# Altium footprint library SBCLib.PcbLib: 120 footprints (part 5 of 8)
Each footprint in its own frame and in the unit in brackets; x right, y up, seen from the top. Pads: shape width x height; smd on the part's side, far side on the other; paste and mask are expansions set on the pad; w line width, h text height; cw(c..) or ccw(c..) is an arc to the next point about the centre after c.
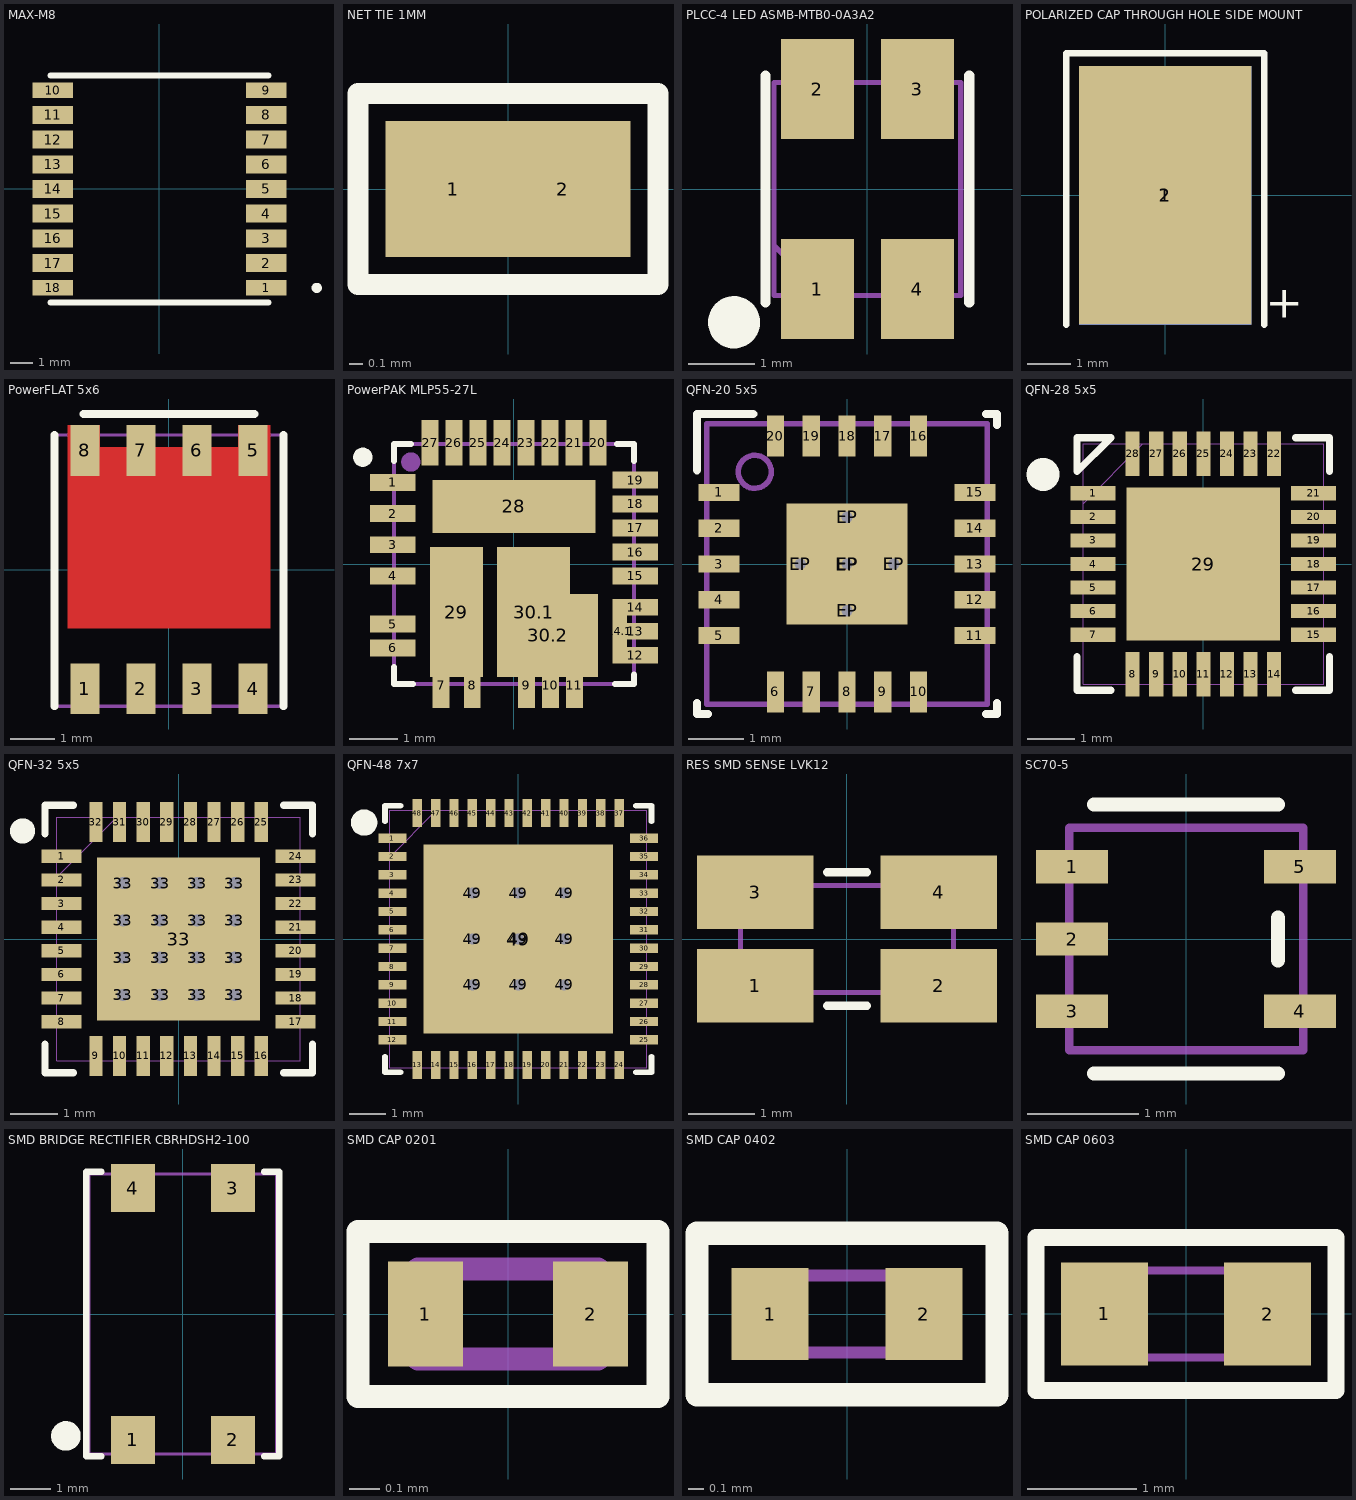
[diagram p4: the footprints below, top view; thin cyan lines are the x and y axes]

## MAX-M8 [mm] "u-blox M8 concurrent GNSS modules"
height 2.7
pads (18):
  rect 1.8x0.7 smd paste-10: 1(4.75,-4.4) 9(4.75,4.4) 10(-4.75,4.4) 18(-4.75,-4.4)
  rect 1.8x0.8 smd paste-10: 2(4.75,-3.3) 3(4.75,-2.2) 4(4.75,-1.1) 5(4.75,0) 6(4.75,1.1) 7(4.75,2.2) 8(4.75,3.3) 11(-4.75,3.3) 12(-4.75,2.2) 13(-4.75,1.1) 14(-4.75,0) 15(-4.75,-1.1) 16(-4.75,-2.2) 17(-4.75,-3.3)
Top Overlay:
  circle w0.254: c7,-4.4 r0.1
  lines w0.254: -4.85,-5.05 4.85,-5.05 ; -4.85,5.05 4.85,5.05
Top Paste:
  region: -6.25,4.75 -6.25,4.05 -4.85,4.05 -4.85,4.15 -3.95,4.15 -3.95,4.65 -4.85,4.65 -4.85,4.75
  region: 6.25,4.05 6.25,4.75 4.85,4.75 4.85,4.65 3.95,4.65 3.95,4.15 4.85,4.15 4.85,4.05
  region: 6.25,-4.75 6.25,-4.05 4.85,-4.05 4.85,-4.15 3.95,-4.15 3.95,-4.65 4.85,-4.65 4.85,-4.75
  region: -6.25,-4.05 -6.25,-4.75 -4.85,-4.75 -4.85,-4.65 -3.95,-4.65 -3.95,-4.15 -4.85,-4.15 -4.85,-4.05
  region: -6.25,3.7 -6.25,2.9 -4.85,2.9 -4.85,3 -3.95,3 -3.95,3.6 -4.85,3.6 -4.85,3.7
  region: -6.25,2.6 -6.25,1.8 -4.85,1.8 -4.85,1.9 -3.95,1.9 -3.95,2.5 -4.85,2.5 -4.85,2.6
  region: -6.25,1.5 -6.25,0.7 -4.85,0.7 -4.85,0.8 -3.95,0.8 -3.95,1.4 -4.85,1.4 -4.85,1.5
  region: -6.25,0.4 -6.25,-0.4 -4.85,-0.4 -4.85,-0.3 -3.95,-0.3 -3.95,0.3 -4.85,0.3 -4.85,0.4
  region: -6.25,-0.7 -6.25,-1.5 -4.85,-1.5 -4.85,-1.4 -3.95,-1.4 -3.95,-0.8 -4.85,-0.8 -4.85,-0.7
  region: -6.25,-1.8 -6.25,-2.6 -4.85,-2.6 -4.85,-2.5 -3.95,-2.5 -3.95,-1.9 -4.85,-1.9 -4.85,-1.8
  region: -6.25,-2.9 -6.25,-3.7 -4.85,-3.7 -4.85,-3.6 -3.95,-3.6 -3.95,-3 -4.85,-3 -4.85,-2.9
  region: 6.25,-3.7 6.25,-2.9 4.85,-2.9 4.85,-3 3.95,-3 3.95,-3.6 4.85,-3.6 4.85,-3.7
  region: 6.25,-2.6 6.25,-1.8 4.85,-1.8 4.85,-1.9 3.95,-1.9 3.95,-2.5 4.85,-2.5 4.85,-2.6
  region: 6.25,-1.5 6.25,-0.7 4.85,-0.7 4.85,-0.8 3.95,-0.8 3.95,-1.4 4.85,-1.4 4.85,-1.5
  region: 6.25,-0.4 6.25,0.4 4.85,0.4 4.85,0.3 3.95,0.3 3.95,-0.3 4.85,-0.3 4.85,-0.4
  region: 6.25,0.7 6.25,1.5 4.85,1.5 4.85,1.4 3.95,1.4 3.95,0.8 4.85,0.8 4.85,0.7
  region: 6.25,1.8 6.25,2.6 4.85,2.6 4.85,2.5 3.95,2.5 3.95,1.9 4.85,1.9 4.85,1.8
  region: 6.25,2.9 6.25,3.7 4.85,3.7 4.85,3.6 3.95,3.6 3.95,3 4.85,3 4.85,2.9
3D body "MAX (STEP-AP214).STEP": height 2.47, standoff 0, extent -4.698,-5.106 5.002,4.994

## NET TIE 1MM [mm]
pads (2):
  rect 1x1 smd paste-10 mask-2: 1(-0.4,0) 2(0.4,0)
Top Overlay:
  lines w0.152: -1.1,-0.7 -1.1,0.7 1.1,0.7 1.1,-0.7 -1.1,-0.7

## PLCC-4 LED ASMB-MTB0-0A3A2 [mm]
pads (4):
  rect 1.1x1.5 smd: 1(-0.75,-1.5) 2(-0.75,1.5) 3(0.75,1.5) 4(0.75,-1.5)
Top Overlay:
  circle w0.5: c-2,-2 r0.141
  lines w0.152: -1.528,-1.7 -1.528,1.7 ; 1.528,-1.7 1.528,1.7
Mechanical 3:
  lines w0.076: -1.4,-0.847 -0.647,-1.6 ; -1.4,-1.6 1.4,-1.6 1.4,1.6 -1.4,1.6 -1.4,-1.6
3D body: height 1.9, standoff 0, extent -1.4,-1.6 1.4,1.6

## POLARIZED CAP THROUGH HOLE SIDE MOUNT [mm]
pads (2):
  rect 4x6 smd: 1(0,0)
  rect 4x6 smd far side: 2(0,0)
Top Overlay:
  lines w0.152: -2.3,-3 -2.3,3.3 2.3,3.3 2.3,-3
  text "+" at 3.2,-2.2 h0.76
Bottom Overlay:
  lines w0.152: -2.3,-3 -2.3,3.3 2.3,3.3 2.3,-3
  text "-" at 2.4,-2.3 h0.76
3D body "PCAP_10x16_PAN.step": height 4.21, standoff -5.81, extent -5.004,-20.692 5.004,0

## PowerFLAT 5x6 [mm]
pads (8):
  rect 0.65x1.15 smd: 1(-1.905,-2.7) 2(-0.635,-2.7) 3(0.635,-2.7) 4(1.905,-2.7) 5(1.905,2.7) 6(0.635,2.7) 7(-0.635,2.7) 8(-1.905,2.7)
Top Layer:
  region: -2.3,3.275 -2.3,-1.325 2.3,-1.325 2.3,3.275 1.575,3.275 1.575,2.775 0.95,2.775 0.95,3.275 0.325,3.275 0.325,2.775 -0.325,2.775 -0.325,3.275 -0.95,3.275 -0.95,2.775 -1.575,2.775 -1.575,3.275
Top Overlay:
  lines w0.178: -2.6,-3.1 -2.6,3.05 ; -1.938,3.527 1.937,3.527 ; 2.6,-3.1 2.6,3.05
Top Paste:
  rectangle: -2.045,-1.118 2.045,1.77
Top Solder:
  region: -2.4,3.375 -2.4,-1.425 2.4,-1.425 2.4,3.375 1.475,3.375 1.475,2.875 1.05,2.875 1.05,3.375 0.225,3.375 0.225,2.875 -0.225,2.875 -0.225,3.375 -1.05,3.375 -1.05,2.875 -1.475,2.875 -1.475,3.375
Mechanical 3:
  circle w0.076: c0,2.253 r0.432
  lines w0.076: -2.6,-3.1 -2.6,3.05 2.6,3.05 2.6,-3.1 -2.6,-3.1
3D body "User Library-Power_Flat_5x6.step": height 0.95, standoff -0.04, extent -2.6,-3.1 2.6,3.05

## PowerPAK MLP55-27L [mm]
pads (32):
  rect 0.95x0.35 smd: 1(-2.525,1.7) 2(-2.525,1.05) 3(-2.525,0.4) 4(-2.525,-0.25) 5(-2.525,-1.25) 6(-2.525,-1.75) 12(2.525,-1.9) 13(2.525,-1.4) 14(2.525,-0.9) 15(2.525,-0.25) 16(2.525,0.25) 17(2.525,0.75) 18(2.525,1.25) 19(2.525,1.75)
  rect 0.35x0.95 smd: 7(-1.52,-2.525) 8(-0.87,-2.525) 9(0.26,-2.525) 10(0.76,-2.525) 11(1.26,-2.525) 20(1.75,2.525) 21(1.25,2.525) 22(0.75,2.525) 23(0.25,2.525) 24(-0.25,2.525) 25(-0.75,2.525) 26(-1.25,2.525) 27(-1.75,2.525)
  rect 0.3x1.35 smd: 14.1(2.2,-1.4)
  rect 3.4x1.1 smd: 28(0,1.2)
  rect 1.1x2.7 smd: 29(-1.2,-1)
  rect 1.52x2.7 smd: 30.1(0.41,-1)
  rect 2.1x1.73 smd: 30.2(0.7,-1.485)
Top Overlay:
  circle w0.2: c-3.15,2.225 r0.1
  lines w0.127: -2.5,-2.15 -2.5,-2.5 -2.1,-2.5 ; -2.5,2.15 -2.5,2.5 -2.15,2.5 ; 2.1,-2.5 2.5,-2.5 2.5,-2.3 ; 2.15,2.5 2.5,2.5 2.5,2.15
Mechanical 3:
  circle w0.2: c-2.15,2.125 r0.1
  lines w0.076: -2.5,2.5 -2.5,-2.5 2.5,-2.5 2.5,2.5 ; -2.5,2.5 2.5,2.5 ; -2.5,2.5 2.5,2.5
3D body: height 0.75, standoff 0, extent -2.5,-2.5 2.5,2.5

## QFN-20 5x5 [mm]
pads (26):
  rect 0.75x0.31 smd paste+0: 1(-2.325,1.3) 2(-2.325,0.65) 3(-2.325,0) 4(-2.325,-0.65) 5(-2.325,-1.3) 11(2.325,-1.3) 12(2.325,-0.65) 13(2.325,0) 14(2.325,0.65) 15(2.325,1.3)
  rect 0.31x0.75 smd paste+0: 6(-1.3,-2.325) 7(-0.65,-2.325) 8(0,-2.325) 9(0.65,-2.325) 10(1.3,-2.325) 16(1.3,2.325) 17(0.65,2.325) 18(0,2.325) 19(-0.65,2.325) 20(-1.3,2.325)
  round 0.5 hole 0.203 mask+0.051: EP(-0.85,0) EP(0,-0.85) EP(0,0) EP(0,0.85) EP(0.85,0)
  rect 2.2x2.2 smd paste-1.087 mask+0.051: EP(0,0)
Top Overlay:
  lines w0.152: -2.725,-2.525 -2.725,-2.725 -2.525,-2.725 ; -2.725,1.7 -2.725,2.725 -1.7,2.725 ; 2.525,-2.725 2.725,-2.725 2.725,-2.525 ; 2.525,2.725 2.725,2.725 2.725,2.525
Top Paste:
  region: 0.101,0.139 0.1,0.149 0.1,1.031 0.101,1.041 0.104,1.05 0.108,1.058 0.114,1.066 0.122,1.072 0.13,1.076 0.139,1.079 0.149,1.08 1.031,1.08 1.041,1.079 1.05,1.076 1.058,1.072 1.066,1.066 1.072,1.058 1.076,1.05 1.079,1.041 1.08,1.031 1.08,0.149 1.079,0.139 1.076,0.13 1.072,0.122 1.066,0.114 1.058,0.108 1.05,0.104 1.041,0.101 1.031,0.1 0.149,0.1 0.139,0.101 0.13,0.104 0.122,0.108 0.114,0.114 0.108,0.122 0.104,0.13
  region: -0.101,1.041 -0.1,1.031 -0.1,0.149 -0.101,0.139 -0.104,0.13 -0.108,0.122 -0.114,0.114 -0.122,0.108 -0.13,0.104 -0.139,0.101 -0.149,0.1 -1.031,0.1 -1.041,0.101 -1.05,0.104 -1.058,0.108 -1.066,0.114 -1.072,0.122 -1.076,0.13 -1.079,0.139 -1.08,0.149 -1.08,1.031 -1.079,1.041 -1.076,1.05 -1.072,1.058 -1.066,1.066 -1.058,1.072 -1.05,1.076 -1.041,1.079 -1.031,1.08 -0.149,1.08 -0.139,1.079 -0.13,1.076 -0.122,1.072 -0.114,1.066 -0.108,1.058 -0.104,1.05
  region: -0.101,-0.139 -0.1,-0.149 -0.1,-1.031 -0.101,-1.041 -0.104,-1.05 -0.108,-1.058 -0.114,-1.066 -0.122,-1.072 -0.13,-1.076 -0.139,-1.079 -0.149,-1.08 -1.031,-1.08 -1.041,-1.079 -1.05,-1.076 -1.058,-1.072 -1.066,-1.066 -1.072,-1.058 -1.076,-1.05 -1.079,-1.041 -1.08,-1.031 -1.08,-0.149 -1.079,-0.139 -1.076,-0.13 -1.072,-0.122 -1.066,-0.114 -1.058,-0.108 -1.05,-0.104 -1.041,-0.101 -1.031,-0.1 -0.149,-0.1 -0.139,-0.101 -0.13,-0.104 -0.122,-0.108 -0.114,-0.114 -0.108,-0.122 -0.104,-0.13
  region: 0.101,-1.041 0.1,-1.031 0.1,-0.149 0.101,-0.139 0.104,-0.13 0.108,-0.122 0.114,-0.114 0.122,-0.108 0.13,-0.104 0.139,-0.101 0.149,-0.1 1.031,-0.1 1.041,-0.101 1.05,-0.104 1.058,-0.108 1.066,-0.114 1.072,-0.122 1.076,-0.13 1.079,-0.139 1.08,-0.149 1.08,-1.031 1.079,-1.041 1.076,-1.05 1.072,-1.058 1.066,-1.066 1.058,-1.072 1.05,-1.076 1.041,-1.079 1.031,-1.08 0.149,-1.08 0.139,-1.079 0.13,-1.076 0.122,-1.072 0.114,-1.066 0.108,-1.058 0.104,-1.05
Mechanical 3:
  circle w0.1: c-1.675,1.675 r0.3
  lines w0.1: -2.55,-2.55 2.55,-2.55 2.55,2.55 -2.55,2.55 -2.55,-2.55
3D body "RGW0020B.stp": height 0.97, standoff -0.03, extent -2.5,-2.5 2.5,2.5

## QFN-28 5x5 [mm]
pads (29):
  rect 0.95x0.3 smd paste+0: 1(-2.34,1.5) 2(-2.34,1) 3(-2.34,0.5) 4(-2.34,0) 5(-2.34,-0.5) 6(-2.34,-1) 7(-2.34,-1.5) 15(2.34,-1.5) 16(2.34,-1) 17(2.34,-0.5) 18(2.34,0) 19(2.34,0.5) 20(2.34,1) 21(2.34,1.5)
  rect 0.3x0.95 smd paste+0: 8(-1.5,-2.34) 9(-1,-2.34) 10(-0.5,-2.34) 11(0,-2.34) 12(0.5,-2.34) 13(1,-2.34) 14(1.5,-2.34) 22(1.5,2.34) 23(1,2.34) 24(0.5,2.34) 25(0,2.34) 26(-0.5,2.34) 27(-1,2.34) 28(-1.5,2.34)
  rect 3.25x3.25 smd paste-1.664 mask+0: 29(0,0)
Top Overlay:
  circle w0.4: c-3.4,1.9 r0.15
  lines w0.152: -2.68,-1.96 -2.68,-2.68 -1.96,-2.68 ; 1.96,-2.68 2.68,-2.68 2.68,-1.96 ; 1.96,2.68 2.68,2.68 2.68,1.96 ; -2.68,1.96 -2.68,2.68 -1.96,2.68 -2.68,1.96
Top Paste:
  region: 1.5,0.1 1.5,1.5 0.1,1.5 0.1,0.1
  region: 0.1,-1.5 1.5,-1.5 1.5,-0.1 0.1,-0.1
  region: -1.5,-0.1 -1.5,-1.5 -0.1,-1.5 -0.1,-0.1
  region: -0.1,1.5 -1.5,1.5 -1.5,0.1 -0.1,0.1
Mechanical 3:
  lines w0.025: -2.553,1.283 -1.283,2.553 ; -2.553,-2.553 2.553,-2.553 2.553,2.553 -2.553,2.553 -2.553,-2.553 ; -2.553,-1.652 -2.553,-1.348 -2.553,-1.652 ; -2.553,-1.152 -2.553,-0.848 -2.553,-1.152 ; -2.553,-0.652 -2.553,-0.348 -2.553,-0.652 ; -2.553,-0.152 -2.553,0.152 -2.553,-0.152 ; -2.553,0.348 -2.553,0.652 -2.553,0.348 ; -2.553,0.848 -2.553,1.152 -2.553,0.848 ; -2.553,1.348 -2.553,1.652 -2.553,1.348 ; -1.652,-2.553 -1.348,-2.553 -1.652,-2.553 ; -1.652,2.553 -1.348,2.553 -1.652,2.553 ; -1.152,-2.553 -0.848,-2.553 -1.152,-2.553 ; -1.152,2.553 -0.848,2.553 -1.152,2.553 ; -0.652,-2.553 -0.348,-2.553 -0.652,-2.553 ; -0.652,2.553 -0.348,2.553 -0.652,2.553 ; -0.152,-2.553 0.152,-2.553 -0.152,-2.553 ; -0.152,2.553 0.152,2.553 -0.152,2.553 ; 0.348,-2.553 0.652,-2.553 0.348,-2.553 ; 0.348,2.553 0.652,2.553 0.348,2.553 ; 0.848,-2.553 1.152,-2.553 0.848,-2.553 ; 0.848,2.553 1.152,2.553 0.848,2.553 ; 1.348,-2.553 1.652,-2.553 1.348,-2.553 ; 1.348,2.553 1.652,2.553 1.348,2.553 ; 2.553,-1.652 2.553,-1.348 2.553,-1.652 ; 2.553,-1.152 2.553,-0.848 2.553,-1.152 ; 2.553,-0.652 2.553,-0.348 2.553,-0.652 ; 2.553,-0.152 2.553,0.152 2.553,-0.152 ; 2.553,0.348 2.553,0.652 2.553,0.348 ; 2.553,0.848 2.553,1.152 2.553,0.848 ; 2.553,1.348 2.553,1.652 2.553,1.348
3D body "21-0140L_T2855-3_MXM.step": height 0.81, standoff 0, extent -2.553,-2.553 2.553,2.553

## QFN-32 5x5 [mm]
pads (49):
  rect 0.85x0.28 smd paste-0.14: 1(-2.475,1.75) 2(-2.475,1.25) 3(-2.475,0.75) 4(-2.475,0.25) 5(-2.475,-0.25) 6(-2.475,-0.75) 7(-2.475,-1.25) 8(-2.475,-1.75) 17(2.475,-1.75) 18(2.475,-1.25) 19(2.475,-0.75) 20(2.475,-0.25) 21(2.475,0.25) 22(2.475,0.75) 23(2.475,1.25) 24(2.475,1.75)
  rect 0.28x0.85 smd paste-0.14: 9(-1.75,-2.475) 10(-1.25,-2.475) 11(-0.75,-2.475) 12(-0.25,-2.475) 13(0.25,-2.475) 14(0.75,-2.475) 15(1.25,-2.475) 16(1.75,-2.475) 25(1.75,2.475) 26(1.25,2.475) 27(0.75,2.475) 28(0.25,2.475) 29(-0.25,2.475) 30(-0.75,2.475) 31(-1.25,2.475) 32(-1.75,2.475)
  round 0.508 hole 0.254: 33(-1.181,-1.181) 33(-1.181,-0.394) 33(-1.181,0.394) 33(-1.181,1.181) 33(-0.394,-1.181) 33(-0.394,-0.394) 33(-0.394,0.394) 33(-0.394,1.181) 33(0.394,-1.181) 33(0.394,-0.394) 33(0.394,0.394) 33(0.394,1.181) 33(1.181,-1.181) 33(1.181,-0.394) 33(1.181,0.394) 33(1.181,1.181)
  rect 3.45x3.45 smd paste-1.712 mask-1.714: 33(0,0)
Top Overlay:
  circle w0.381: c-3.302,2.286 r0.075
  lines w0.152: -2.829,-2.223 -2.829,-2.829 -2.223,-2.829 ; -2.829,2.223 -2.829,2.829 -2.223,2.829 ; 2.223,-2.829 2.829,-2.829 2.829,-2.223 ; 2.223,2.829 2.829,2.829 2.829,2.223
Top Paste:
  drawing of 57 lines, arcs and shapes, not listed
Top Solder:
  drawing of 42 lines, arcs and shapes, not listed
Mechanical 3:
  lines w0.025: -2.575,1.305 -1.305,2.575 ; -2.575,-2.575 2.575,-2.575 2.575,2.575 -2.575,2.575 -2.575,-2.575 ; -2.575,-1.9 -2.575,-1.6 -2.575,-1.9 ; -2.575,-1.4 -2.575,-1.1 -2.575,-1.4 ; -2.575,-0.9 -2.575,-0.6 -2.575,-0.9 ; -2.575,-0.4 -2.575,-0.1 -2.575,-0.4 ; -2.575,0.1 -2.575,0.4 -2.575,0.1 ; -2.575,0.6 -2.575,0.9 -2.575,0.6 ; -2.575,1.1 -2.575,1.4 -2.575,1.1 ; -2.575,1.6 -2.575,1.9 -2.575,1.6 ; -1.9,-2.575 -1.6,-2.575 -1.9,-2.575 ; -1.9,2.575 -1.6,2.575 -1.9,2.575 ; -1.4,-2.575 -1.1,-2.575 -1.4,-2.575 ; -1.4,2.575 -1.1,2.575 -1.4,2.575 ; -0.9,-2.575 -0.6,-2.575 -0.9,-2.575 ; -0.9,2.575 -0.6,2.575 -0.9,2.575 ; -0.4,-2.575 -0.1,-2.575 -0.4,-2.575 ; -0.4,2.575 -0.1,2.575 -0.4,2.575 ; 0.1,-2.575 0.4,-2.575 0.1,-2.575 ; 0.1,2.575 0.4,2.575 0.1,2.575 ; 0.6,-2.575 0.9,-2.575 0.6,-2.575 ; 0.6,2.575 0.9,2.575 0.6,2.575 ; 1.1,-2.575 1.4,-2.575 1.1,-2.575 ; 1.1,2.575 1.4,2.575 1.1,2.575 ; 1.6,-2.575 1.9,-2.575 1.6,-2.575 ; 1.6,2.575 1.9,2.575 1.6,2.575 ; 2.575,-1.9 2.575,-1.6 2.575,-1.9 ; 2.575,-1.4 2.575,-1.1 2.575,-1.4 ; 2.575,-0.9 2.575,-0.6 2.575,-0.9 ; 2.575,-0.4 2.575,-0.1 2.575,-0.4 ; 2.575,0.1 2.575,0.4 2.575,0.1 ; 2.575,0.6 2.575,0.9 2.575,0.6 ; 2.575,1.1 2.575,1.4 2.575,1.1 ; 2.575,1.6 2.575,1.9 2.575,1.6
3D body "RHB0032E.stp": height 1, standoff 0, extent -2.5,-2.5 2.5,2.5

## QFN-48 7x7 [mil]
pads (58):
  rect 30x10 smd paste+0: 1(-135,108.27) 2(-135,88.58) 3(-135,68.9) 4(-135,49.21) 5(-135,29.53) 6(-135,9.84) 7(-135,-9.84) 8(-135,-29.53) 9(-135,-49.21) 10(-135,-68.9) 11(-135,-88.58) 12(-135,-108.27) 25(135,-108.27) 26(135,-88.58) 27(135,-68.9) 28(135,-49.21) 29(135,-29.53) 30(135,-9.84) 31(135,9.84) 32(135,29.53) 33(135,49.21) 34(135,68.9) 35(135,88.58) 36(135,108.27)
  rect 10x30 smd paste+0: 13(-108.27,-135) 14(-88.58,-135) 15(-68.9,-135) 16(-49.21,-135) 17(-29.53,-135) 18(-9.84,-135) 19(9.84,-135) 20(29.53,-135) 21(49.21,-135) 22(68.9,-135) 23(88.58,-135) 24(108.27,-135) 37(108.27,135) 38(88.58,135) 39(68.9,135) 40(49.21,135) 41(29.53,135) 42(9.84,135) 43(-9.84,135) 44(-29.53,135) 45(-49.21,135) 46(-68.9,135) 47(-88.58,135) 48(-108.27,135)
  round 25 hole 12: 49(-49.21,-49.21) 49(-49.21,0) 49(-49.21,49.21) 49(0,-49.21) 49(0,0) 49(0,49.21) 49(49.21,-49.21) 49(49.21,0) 49(49.21,49.21)
  rect 203x203 smd paste-101: 49(0,0)
Top Overlay:
  circle w15: c-165.35,125 r6.6
  lines w6: -143,-126.37 -143,-143 -126.37,-143 ; -143,126.37 -143,143 -126.37,143 ; 126.37,-143 143,-143 143,-126.37 ; 126.37,143 143,143 143,126.37
Top Paste:
  rectangle: -19.68,-68.9 19.68,-29.53
  rectangle: 29.53,-68.9 68.9,-29.53
  region: -29.53,-29.53 -68.9,-29.53 -68.9,-68.9 -29.53,-68.9
  rectangle: -19.68,29.53 19.68,68.9
  rectangle: 29.53,29.53 68.9,68.9
  region: -29.53,68.9 -68.9,68.9 -68.9,29.53 -29.53,29.53
  region: -29.53,19.68 -68.9,19.69 -68.9,-19.68 -29.53,-19.69
  rectangle: 29.53,-19.68 68.9,19.68
  rectangle: -19.68,-19.68 19.68,19.68
Mechanical 3:
  lines w1: -138,88 -88,138 ; -138,-138 -138,138 138,138 138,-138 -138,-138 ; -138,-114.27 -138,-102.27 -138,-114.27 ; -138,-94.58 -138,-82.58 -138,-94.58 ; -138,-74.9 -138,-62.9 -138,-74.9 ; -138,-55.21 -138,-43.21 -138,-55.21 ; -138,-35.53 -138,-23.53 -138,-35.53 ; -138,-15.84 -138,-3.84 -138,-15.84 ; -138,3.84 -138,15.84 -138,3.84 ; -138,23.53 -138,35.53 -138,23.53 ; -138,43.21 -138,55.21 -138,43.21 ; -138,62.9 -138,74.9 -138,62.9 ; -138,82.58 -138,94.58 -138,82.58 ; -138,102.27 -138,114.27 -138,102.27 ; -114.27,-138 -102.27,-138 -114.27,-138 ; -114.27,138 -102.27,138 -114.27,138 ; -94.58,-138 -82.58,-138 -94.58,-138 ; -94.58,138 -82.58,138 -94.58,138 ; -74.9,-138 -62.9,-138 -74.9,-138 ; -74.9,138 -62.9,138 -74.9,138 ; -55.21,-138 -43.21,-138 -55.21,-138 ; -55.21,138 -43.21,138 -55.21,138 ; -35.53,-138 -23.53,-138 -35.53,-138 ; -35.53,138 -23.53,138 -35.53,138 ; -15.84,-138 -3.84,-138 -15.84,-138 ; -15.84,138 -3.84,138 -15.84,138 ; 3.84,-138 15.84,-138 3.84,-138 ; 3.84,138 15.84,138 3.84,138 ; 23.53,-138 35.53,-138 23.53,-138 ; 23.53,138 35.53,138 23.53,138 ; 43.21,-138 55.21,-138 43.21,-138 ; 43.21,138 55.21,138 43.21,138 ; 62.9,-138 74.9,-138 62.9,-138 ; 62.9,138 74.9,138 62.9,138 ; 82.58,-138 94.58,-138 82.58,-138 ; 82.58,138 94.58,138 82.58,138 ; 102.27,-138 114.27,-138 102.27,-138 ; 102.27,138 114.27,138 102.27,138 ; 138,-114.27 138,-102.27 138,-114.27 ; 138,-94.58 138,-82.58 138,-94.58 ; 138,-74.9 138,-62.9 138,-74.9 ; 138,-55.21 138,-43.21 138,-55.21 ; 138,-35.53 138,-23.53 138,-35.53 ; 138,-15.84 138,-3.84 138,-15.84 ; 138,3.84 138,15.84 138,3.84 ; 138,23.53 138,35.53 138,23.53 ; 138,43.21 138,55.21 138,43.21 ; 138,62.9 138,74.9 138,62.9 ; 138,82.58 138,94.58 138,82.58 ; 138,102.27 138,114.27 138,102.27
3D body "QFN-48_MCH.step": height 35.12, standoff 0, extent -137.99,-137.99 138,138

## RES SMD SENSE LVK12 [mm]
pads (4):
  rect 1.75x1.1 smd: 1(-1.375,-0.7) 2(1.375,-0.7) 3(-1.375,0.7) 4(1.375,0.7)
Top Overlay:
  lines w0.127: -0.3,-1 0.3,-1 ; -0.3,1 0.3,1
Mechanical 3:
  lines w0.076: -1.6,-0.8 -1.6,0.8 1.6,0.8 1.6,-0.8 -1.6,-0.8
3D body: height 0.5, standoff 0, extent -1.6,-0.8 1.6,0.8

## SC70-5 [mm]
pads (5):
  rect 0.648x0.3 smd: 1(-1.022,0.65) 2(-1.022,0) 3(-1.022,-0.65) 4(1.022,-0.65) 5(1.022,0.65)
Top Overlay:
  lines w0.127: -0.826,-1.206 0.826,-1.206 ; -0.826,1.206 0.826,1.206 ; 0.826,-0.19 0.826,0.19
Mechanical 3:
  lines w0.076: -1.05,-1 -1.05,1 1.05,1 1.05,-1 -1.05,-1
3D body "DCK0005A.stp": height 1, standoff 0, extent -1.05,-1 1.05,1

## SMD BRIDGE RECTIFIER CBRHDSH2-100 [mm]
pads (4):
  rect 1.1x1.2 smd: 1(-1.25,-3.15) 2(1.25,-3.15) 3(1.25,3.15) 4(-1.25,3.15)
Top Overlay:
  circle w0.381: c-2.921,-3.048 r0.18
  lines w0.152: -2.032,-3.556 -2.413,-3.556 -2.413,3.556 -2.032,3.556 ; 2.032,-3.556 2.413,-3.556 2.413,3.556 2.032,3.556
Mechanical 3:
  lines w0.076: -2.35,-3.5 2.35,-3.5 2.35,3.5 -2.35,3.5 -2.35,-3.5
3D body "CBRHDSH2-100_TR13.stp": height 2.9, standoff 0, extent -2.35,-3.5 2.35,3.5

## SMD CAP 0201 [mm]
pads (2):
  rect 0.25x0.35 smd mask+0.05: 1(-0.275,0) 2(0.275,0)
Top Overlay:
  lines w0.076: -0.5,-0.275 0.5,-0.275 0.5,0.275 -0.5,0.275 -0.5,-0.275
Mechanical 3:
  lines w0.076: -0.3,-0.15 -0.3,0.15 0.3,0.15 0.3,-0.15 -0.3,-0.15
3D body "C0201_020.step": height 0.2, standoff 0, extent -0.3,-0.15 0.3,0.15

## SMD CAP 0402 [mm]
pads (2):
  rect 0.5x0.6 smd mask+0.05: 1(-0.5,0) 2(0.5,0)
Top Overlay:
  lines w0.152: -0.976,-0.526 0.976,-0.526 0.976,0.526 -0.976,0.526 -0.976,-0.526
Mechanical 3:
  lines w0.076: -0.5,-0.25 0.5,-0.25 0.5,0.25 -0.5,0.25 -0.5,-0.25
3D body "C0402_035.step": height 0.35, standoff 0, extent -0.5,-0.25 0.5,0.25

## SMD CAP 0603 [mm]
pads (2):
  rect 0.8x0.95 smd mask+0.05: 1(-0.75,0) 2(0.75,0)
Top Overlay:
  lines w0.152: -1.378,-0.703 1.378,-0.703 1.378,0.703 -1.378,0.703 -1.378,-0.703
Mechanical 3:
  lines w0.076: -0.8,-0.4 -0.8,0.4 0.8,0.4 0.8,-0.4 -0.8,-0.4
3D body "C0603_060.step": height 0.6, standoff 0, extent -0.8,-0.4 0.8,0.4